# Altium footprint library ThroHoleCap.PcbLib: 81 footprints (part 2 of 6)
Each footprint in its own frame and in the unit in brackets; x right, y up, seen from the top. Pads: shape width x height; smd on the part's side, far side on the other; paste and mask are expansions set on the pad; w line width, h text height; cw(c..) or ccw(c..) is an arc to the next point about the centre after c.
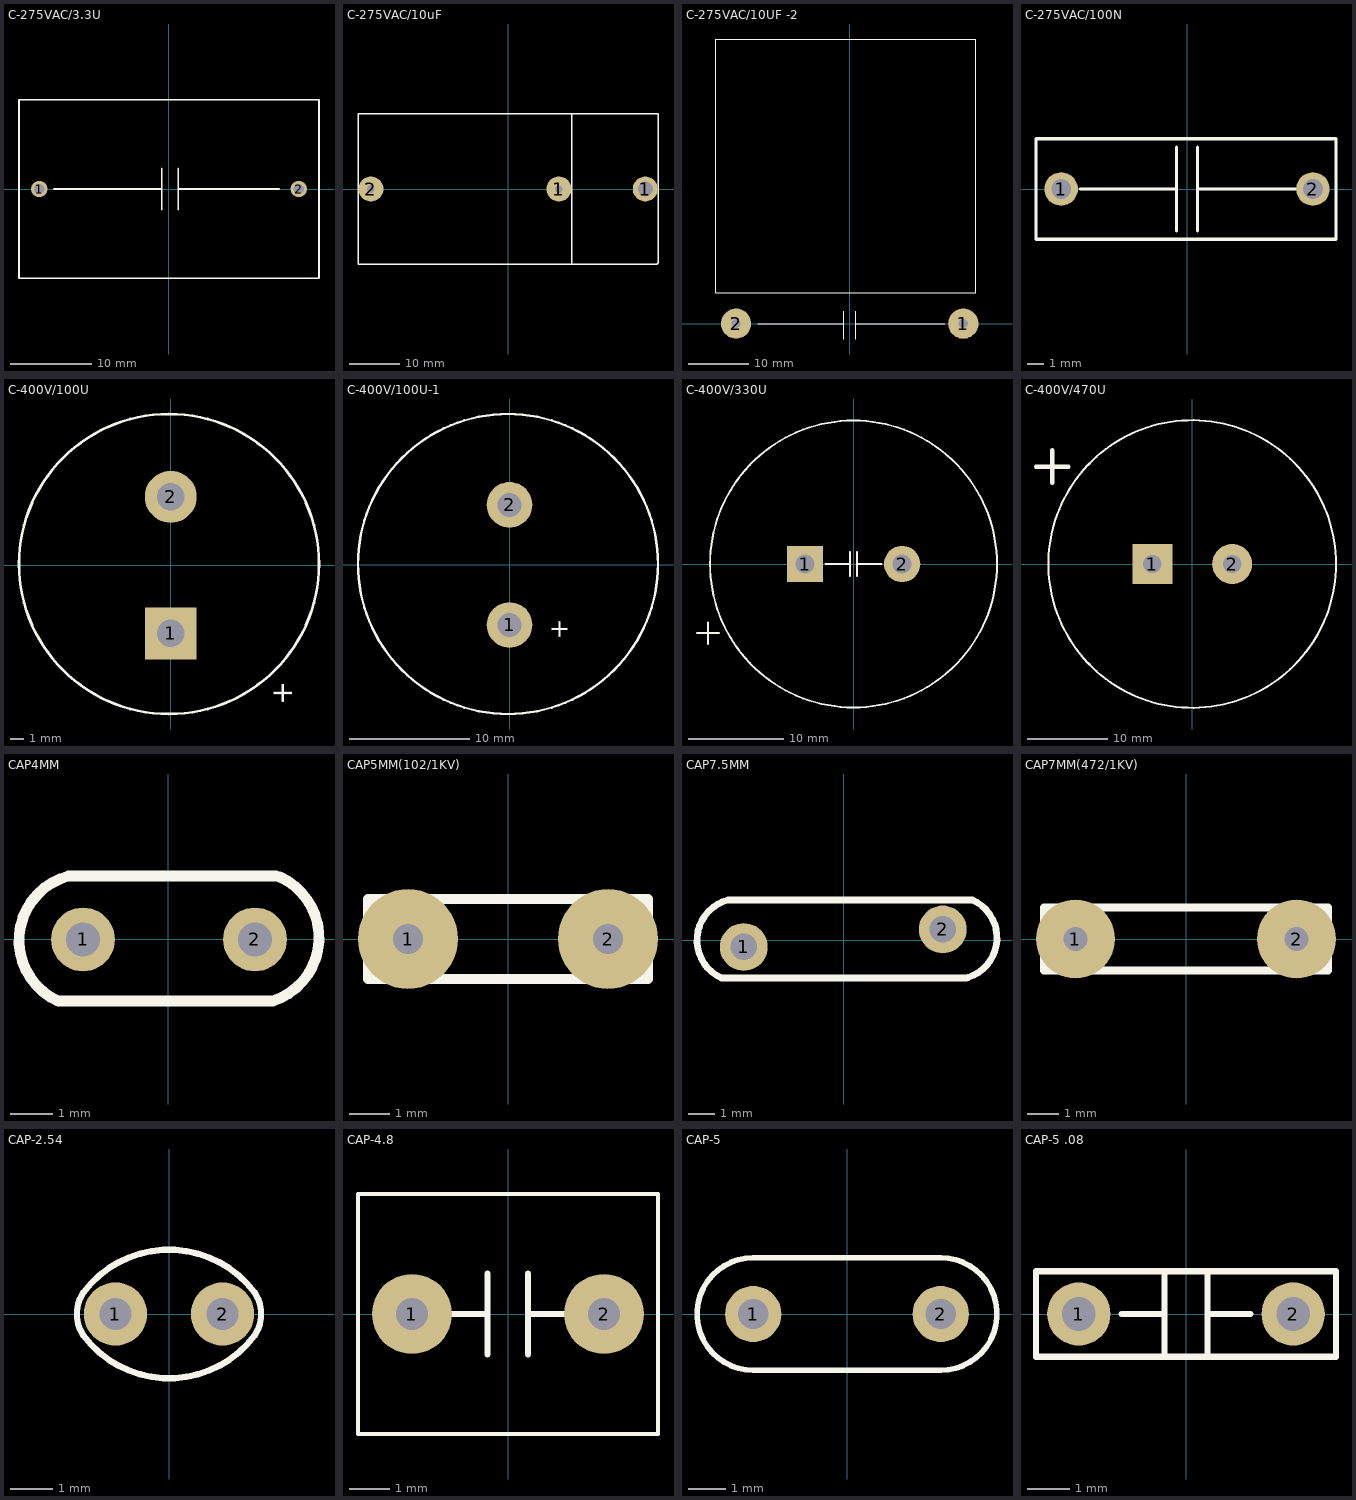
[diagram p1: the footprints below, top view; thin cyan lines are the x and y axes]

## C-275VAC/3.3U [mil]
pads (2):
  round 80 hole 50: 1(-629.92,0) 2(629.92,0)
Top Overlay:
  lines w8: -559.92,0 -34.92,0 ; -34.92,-100 -34.92,100 ; 45.08,-100 45.08,100 ; 45.08,0 535.08,0 ; -728.35,-433.07 728.35,-433.07 728.35,433.07 -728.35,433.07 -728.35,-433.07

## C-275VAC/10uF [mm]
pads (3):
  round 5 hole 1.5: 1(10.154,-0.001) 2(-27.426,0.001)
  round 5 hole 3: 1(27.426,-0.001)
Top Overlay:
  lines w0.254: 29.966,14.764 29.966,15.001 ; 12.694,-14.998 29.701,-14.998 29.966,-14.733 29.966,15.001 ; 12.694,-14.998 -29.994,-14.998 -29.994,15.001 12.694,15.001 ; 12.694,-14.998 12.694,15.001 ; 12.694,-14.998 12.694,15.001 ; 12.694,15.001 29.966,15.001

## C-275VAC/10UF -2 [mm]
pads (2):
  round 5 hole 1.5: 1(18.79,-0.001) 2(-18.79,0.001)
Top Overlay:
  lines w0.2: -22.172,47.08 -22.172,5.08 20.828,5.08 20.828,47.08
  lines w0.203: -22.172,47.08 20.828,47.08 ; -15.24,0 -1.016,0 ; -1.016,-2.54 -1.016,2.032 ; 1.016,-2.54 1.016,2.032 ; 1.016,0 15.748,0

## C-275VAC/100N [mil]
pads (2):
  round 80 hole 47: 1(-300,0) 2(300,0)
Top Overlay:
  lines w8: -255,0 -25,0 ; -25,-100 -25,100 ; 25,-100 25,100 ; 25,0 290,0 ; -360,-120 355,-120 355,120 -360,120 -360,-120

## C-400V/100U [mil]
pads (2):
  rect 150x150 hole 79: 1(0,-197)
  round 150 hole 79: 2(0,197)
Top Overlay:
  circle w8: c-5,3 r433
  text "+" at 298,-336 h60

## C-400V/100U-1 [mil]
pads (2):
  round 150 hole 79: 1(0,-197) 2(0,197)
Top Overlay:
  circle w8: c-5,3 r492.13
  text "+" at 138,-176 h60

## C-400V/330U [mil]
pads (2):
  rect 150x150 hole 79: 1(-200,0)
  round 150 hole 79: 2(200,0)
Top Overlay:
  circle w8: c0,0 r591
  lines w8: -645,-285 -555,-285 ; -600,-330 -600,-240 ; -115,0 -15,0 ; -15,-50 -15,50 ; 15,-50 15,50 ; 15,0 115,0

## C-400V/470U [mm]
pads (2):
  rect 5x5 hole 2.3: 1(-5,0)
  round 5 hole 2.3: 2(5,0)
Top Overlay:
  circle w0.254: c0,0 r18
  lines w0.54: -19.558,12.192 -15.494,12.192 ; -17.526,10.16 -17.526,14.224

## CAP4MM [mm]
pads (2):
  round 1.5 hole 0.8: 1(-2,0) 2(2.04,0)
Top Overlay:
  lines w0.254: -2.58,-1.45 cw(c-1.94,-0.023) -2.34,1.49 ; -2.52,-1.45 2.42,-1.45 ; -2.32,1.49 2.538,1.49 ; 2.459,-1.447 ccw(c1.98,0.042) 2.62,1.47
3D body "RAD.2.step": height 7.5, standoff -1, extent -3.465,-0.899 3.526,0.798

## CAP5MM(102/1KV) [mm]
pads (2):
  round 2.5 hole 0.75: 1(-2.5,0) 2(2.5,0)
Top Overlay:
  lines w0.254: -3.5,-1 3.5,-1 3.5,1 -3.5,1 -3.5,-1

## CAP7.5MM [mm]
pads (2):
  round 1.8 hole 1: 1(-3.759,-0.254) 2(3.734,0.406)
Top Overlay:
  lines w0.254: 4.623,-1.425 -4.597,-1.425 cw(c-3.958,0.003) -4.357,1.516 4.851,1.516 cw(c4.212,0.088) 4.69,-1.401
3D body "final MOV7,5.step": height 18.5, standoff 0, extent -5.5,-0.849 5.784,1

## CAP7MM(472/1KV) [mm]
pads (2):
  round 2.5 hole 0.75: 1(-3.5,0) 2(3.5,0)
Top Overlay:
  lines w0.254: -4.5,-1 -4.5,1 4.5,1 4.5,-1 -4.5,-1

## CAP-2.54 [mm]
pads (2):
  round 1.5 hole 0.762: 1(-1.27,0) 2(1.27,0)
Top Overlay:
  lines w0.15: -2.032,-0.508 ccw(c0,1.016) 2.032,-0.508 ; -2.032,0.508 cw(c0,-1.016) 2.032,0.508 ; -2.031,-0.507 cw(c-1.27,0) -2.031,0.507 ; 2.031,-0.507 ccw(c1.27,0) 2.031,0.507
3D body "Cap_100n.step": height 5.92, standoff -2, extent -2.923,-0.848 2.919,0.848

## CAP-4.8 [mm]
pads (2):
  round 2 hole 0.8: 1(-2.4,0) 2(2.4,0)
Top Overlay:
  lines w0.1: -3.75,-3 -3.75,3 3.75,3 3.75,-3 -3.75,-3
  lines w0.15: -1.531,0 -0.515,0 ; -0.515,-1.016 -0.515,1.016 ; 0.501,-1.016 0.501,1.016 ; 0.501,0 1.517,0
3D body "User Library-folienkondi - wima mks 2.step": height 11.5, standoff -3, extent -3.6,-2.7 3.6,2.7

## CAP-5 [mm]
pads (2):
  round 1.5 hole 0.8: 1(-2.5,0) 2(2.5,0)
Top Overlay:
  lines w0.15: -2.5,-1.5 cw(c-2.5,0) -2.5,1.5 2.5,1.5 cw(c2.5,0) 2.5,-1.5 -2.5,-1.5
3D body "User Library-100n.step": height 7.6, standoff -4.6, extent -3.75,-1.25 3.75,1.25

## CAP-5 .08 [mm]
pads (2):
  round 1.5 hole 0.8: 1(-2.54,0) 2(2.54,0)
Top Overlay:
  lines w0.15: -1.524,0 -0.508,0 ; -0.508,-1.016 -0.508,1.016 ; 0.508,-1.016 0.508,1.016 ; 0.508,0 1.524,0 ; -3.556,-1.016 -3.556,1.016 3.556,1.016 3.556,-1.016 -3.556,-1.016
3D body "SW3dPS-CAPNP5.STEP": height 6.51, standoff -1.26, extent -3.81,-1.27 3.81,1.27